# Altium footprint library IC.PcbLib: 67 footprints (part 2 of 5)
Each footprint in its own frame and in the unit in brackets; x right, y up, seen from the top. Pads: shape width x height; smd on the part's side, far side on the other; paste and mask are expansions set on the pad; w line width, h text height; cw(c..) or ccw(c..) is an arc to the next point about the centre after c.
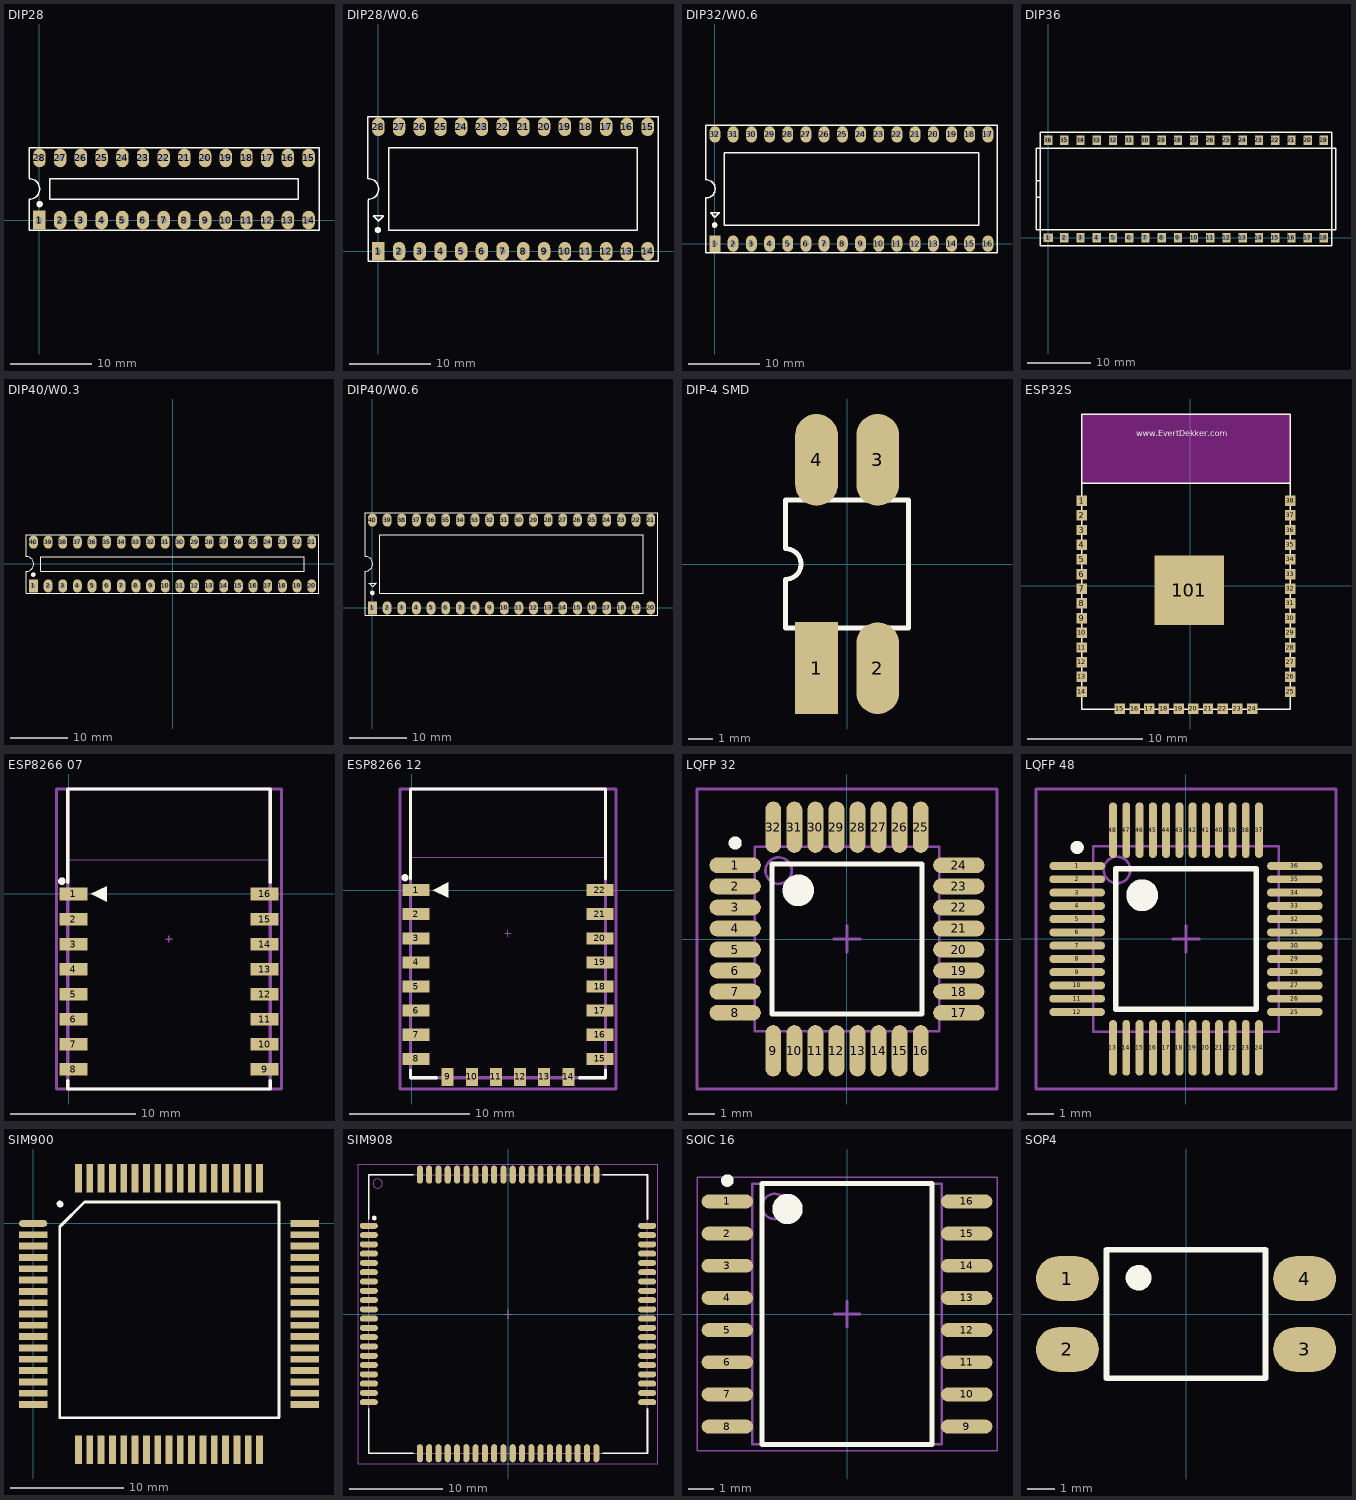
[diagram p1: the footprints below, top view; thin cyan lines are the x and y axes]

## DIP28 [mil] "28 PIN, W 300mil, Pin to pin 100mil"
height 100
pads (28):
  rect 60x90 hole 31: 1(0,0)
  oval 60x90 hole 31: 2(100,0) 3(200,0) 4(300,0) 5(400,0) 6(500,0) 7(600,0) 8(700,0) 9(800,0) 10(900,0) 11(1000,0) 12(1100,0) 13(1200,0) 14(1300,0) 15(1300,300) 16(1200,300) 17(1100,300) 18(1000,300) 19(900,300) 20(800,300) 21(700,300) 22(600,300) 23(500,300) 24(400,300) 25(300,300) 26(200,300) 27(100,300) 28(0,300)
Top Overlay:
  circle w15: c1,77 r8
  lines w7: -50.38,100.05 ccw(c-48.69,150.02) -50,200 ; -50,100 -50,-50 1350,-50 1350,350 -50,350 -50,201 ; 50,100 50,200 1250,200 1250,100 50,100
3D body "SW3dPS-DIP28-300.STEP": height 200, standoff -98.03, extent -50,-10 1367.32,299.84

## DIP28/W0.6 [mil] "DIP28/W.600, Pin to pin 100mil"
height 100
pads (28):
  rect 60x90 hole 31: 1(0,0)
  oval 60x90 hole 31: 2(100,0) 3(200,0) 4(300,0) 5(400,0) 6(500,0) 7(600,0) 8(700,0) 9(800,0) 10(900,0) 11(1000,0) 12(1100,0) 13(1200,0) 14(1300,0) 15(1300,600) 16(1200,600) 17(1100,600) 18(1000,600) 19(900,600) 20(800,600) 21(700,600) 22(600,600) 23(500,600) 24(400,600) 25(300,600) 26(200,600) 27(100,600) 28(0,600)
Top Overlay:
  circle w15: c-2,102 r8
  lines w7: -51,350 -51,650 1350,650 1350,-50 -50,-50 -50,249 ; -50,250 ccw(c-48.31,299.97) -49.62,349.95 ; -25,170 23,170 24,171 24,169 0,145 0,146 -24,170 -25,170 ; 50,100 50,500 1250,500 1250,100 50,100
3D body "SW3dPS-DIP28-600.STEP": height 224.41, standoff -101.57, extent -84.25,0.16 1384.25,610

## DIP32/W0.6 [mil] "DIP32/W.600, Pin to pin 100mil"
height 100
pads (32):
  rect 60x90 hole 31: 1(0,0)
  oval 60x90 hole 31: 2(100,0) 3(200,0) 4(300,0) 5(400,0) 6(500,0) 7(600,0) 8(700,0) 9(800,0) 10(900,0) 11(1000,0) 12(1100,0) 13(1200,0) 14(1300,0) 15(1400,0) 16(1500,0) 17(1500,600) 18(1400,600) 19(1300,600) 20(1200,600) 21(1100,600) 22(1000,600) 23(900,600) 24(800,600) 25(700,600) 26(600,600) 27(500,600) 28(400,600) 29(300,600) 30(200,600) 31(100,600) 32(0,600)
Top Overlay:
  circle w15: c-2,102 r8
  lines w7: -50.38,251.05 ccw(c-48.69,301.02) -50,351 ; -50,251 -50,-50 1550,-50 1550,650 -50,650 -50,352 ; -25,170 -24,170 0,146 0,145 24,169 24,171 23,170 -25,170 ; 50,100 50,500 1450,500 1450,100 50,100
3D body "SW3DPS-DIP 32 IC WITH 0_380IN WINDOW-DEFAULT.STEP": height 227.95, standoff -129.92, extent -77.56,0 1577.56,601.81

## DIP36 [mil] "W.600/L1.850"
pads (36):
  rect 59x51 / inner rect 58x58 / far side rect 59x51 hole 34: 1(0,0)
  rect 51x59 / inner round 58 / far side rect 51x59 hole 34: 2(100,0) 3(200,0) 4(300,0) 5(400,0) 6(500,0) 7(600,0) 8(700,0) 9(800,0) 10(900,0) 11(1000,0) 12(1100,0) 13(1200,0) 14(1300,0) 15(1400,0) 16(1500,0) 17(1600,0) 18(1700,0) 19(1700,600) 20(1600,600) 21(1500,600) 22(1400,600) 23(1300,600) 24(1200,600) 25(1100,600) 26(1000,600) 27(900,600) 28(800,600) 29(700,600) 30(600,600) 31(500,600) 32(400,600) 33(300,600) 34(200,600) 35(100,600) 36(0,600)
Top Overlay:
  lines w8: -75,50 -75,250 ; -75,50 1775,50 ; -75,50 -75,250 ; -75,50 1775,50 ; -75,250 -50,250 ; -75,250 -75,350 ; -75,250 -50,250 ; -75,250 -75,350 ; -75,350 -50,350 ; -75,350 -75,550 ; -75,350 -50,350 ; -75,350 -75,550 ; -75,550 1775,550 ; -75,550 1775,550 ; -50,250 -50,350 ; -50,250 -50,350 ; -50,350 -50,650 1750,650 1750,-50 -50,-50 -50,350 ; 1775,50 1775,550 ; 1775,50 1775,550

## DIP40/W0.3 [mil] "40 PIN, W 300mil, Pin to pin 100mil"
height 100
pads (40):
  rect 60x90 hole 31: 1(-950,-150)
  oval 60x90 hole 31: 2(-850,-150) 3(-750,-150) 4(-650,-150) 5(-550,-150) 6(-450,-150) 7(-350,-150) 8(-250,-150) 9(-150,-150) 10(-50,-150) 11(50,-150) 12(150,-150) 13(250,-150) 14(350,-150) 15(450,-150) 16(550,-150) 17(650,-150) 18(750,-150) 19(850,-150) 20(950,-150) 21(950,150) 22(850,150) 23(750,150) 24(650,150) 25(550,150) 26(450,150) 27(350,150) 28(250,150) 29(150,150) 30(50,150) 31(-50,150) 32(-150,150) 33(-250,150) 34(-350,150) 35(-450,150) 36(-550,150) 37(-650,150) 38(-750,150) 39(-850,150) 40(-950,150)
Top Overlay:
  circle w15: c-951,-72 r8
  lines w7: -1000.38,-49.95 ccw(c-998.68,0.02) -1000,50 ; -1000,-50 -1000,-200 1000,-200 1000,200 -1000,200 -1000,51 ; -900,-50 -900,50 900,50 900,-50 -900,-50
3D body "SW3DPS-DIP 40 IC WITH 0_320IN WINDOW-DEFAULT.STEP": height 227.95, standoff -129.92, extent -1020,-310.91 1050.87,290.91

## DIP40/W0.6 [mil] "40 PIN, W 600mil, Pin to pin 100mil"
height 100
pads (40):
  rect 60x90 hole 31: 1(0,0)
  oval 60x90 hole 31: 2(100,0) 3(200,0) 4(300,0) 5(400,0) 6(500,0) 7(600,0) 8(700,0) 9(800,0) 10(900,0) 11(1000,0) 12(1100,0) 13(1200,0) 14(1300,0) 15(1400,0) 16(1500,0) 17(1600,0) 18(1700,0) 19(1800,0) 20(1900,0) 21(1900,600) 22(1800,600) 23(1700,600) 24(1600,600) 25(1500,600) 26(1400,600) 27(1300,600) 28(1200,600) 29(1100,600) 30(1000,600) 31(900,600) 32(800,600) 33(700,600) 34(600,600) 35(500,600) 36(400,600) 37(300,600) 38(200,600) 39(100,600) 40(0,600)
Top Overlay:
  circle w15: c-1,102 r8
  lines w7: -50.38,251.05 ccw(c-48.69,301.02) -50,351 ; -50,251 -50,-50 1950,-50 1950,650 -50,650 -50,352 ; -24,170 -23,170 1,146 1,145 25,169 25,171 24,170 -24,170 ; 50,100 1850,100 1850,500 50,500 50,100
3D body "SW3dPS-DIP40-600.STEP": height 224.41, standoff -101.57, extent -82.48,-10 1982.48,599.84

## DIP-4 SMD [mil] "DIP; 4 Leads; Row Spacing 7.62 mm; Pitch 2.54 mm"
height 179.92
pads (4):
  rect 70x150 smd: 1(-50,-170)
  oval 70x150 smd: 2(50,-170) 3(50,170) 4(-50,170)
Top Overlay:
  lines w7.87: -100.39,-104.33 100.39,-104.33 100.39,104.33 -100.39,104.33 -100.39,25 cw(c-100.39,0) -100.39,-25 -100.39,-104.33
3D body "DIP 4 SMD.step": height 181.77, standoff 0.6, extent -98.39,-209.9 102.39,201.91

## ESP32S [mm]
pads (39):
  rect 0.9x0.9 smd: 1(-9.398,7.366) 2(-9.398,6.096) 3(-9.398,4.826) 4(-9.398,3.556) 5(-9.398,2.286) 6(-9.398,1.016) 7(-9.398,-0.254) 8(-9.398,-1.524) 9(-9.398,-2.794) 10(-9.398,-4.064) 11(-9.398,-5.334) 12(-9.398,-6.604) 13(-9.398,-7.874) 14(-9.398,-9.144) 15(-6.098,-10.634) 16(-4.828,-10.634) 17(-3.558,-10.634) 18(-2.288,-10.634) 19(-1.018,-10.634) 20(0.252,-10.634) 21(1.522,-10.634) 22(2.792,-10.634) 23(4.062,-10.634) 24(5.332,-10.634) 25(8.636,-9.144) 26(8.636,-7.874) 27(8.636,-6.604) 28(8.636,-5.334) 29(8.636,-4.064) 30(8.636,-2.794) 31(8.636,-1.524) 32(8.636,-0.254) 33(8.636,1.016) 34(8.636,2.286) 35(8.636,3.556) 36(8.636,4.826) 37(8.636,6.096) 38(8.636,7.366)
  rect 6x6 smd: 101(-0.098,-0.368)
Top Overlay:
  lines w0.127: -9.398,8.89 8.636,8.89 ; -9.398,-10.668 8.636,-10.668 8.636,14.859 -9.398,14.859 -9.398,-10.668
  text "www.EvertDekker.com" at -4.699,12.954 h0.5
Keep-Out Layer:
  rectangle: -9.398,8.89 8.636,14.859
3D body: height 2, standoff 0.8, extent -8.763,-10.033 8.128,8.89
3D body: height 0.8, standoff 0, extent -9.398,-10.668 8.636,14.859

## ESP8266 07 [mm] "ESP-12 Wi-Fi Module by AI-Thinker"
height 3.2
pads (16):
  rect 2.25x1 smd: 1(0.375,0) 2(0.375,-2) 3(0.375,-4) 4(0.375,-6) 5(0.375,-8) 6(0.375,-10) 7(0.375,-12) 8(0.375,-14) 9(15.625,-14) 10(15.625,-12) 11(15.625,-10) 12(15.625,-8) 13(15.625,-6) 14(15.625,-4) 15(15.625,-2) 16(15.625,0)
Top Overlay:
  circle w0.3: c-0.55,1.025 r0.15
  region: 1.77,0 3.04,-0.635 3.04,0.635
  lines w0.254: -0.084,-14.916 -0.084,-15.568 16.084,-15.568 16.084,-14.916 ; -0.084,0.916 -0.084,8.371 16.084,8.371 16.084,0.916
Mechanical 13:
  lines w0.051: -0.127,2.727 -0.127,8.382 16.129,8.382 16.129,2.727 -0.127,2.727
  lines w0.254: -0.084,-15.568 16.084,-15.568 16.084,8.371 -0.084,8.371 -0.084,-15.568
  text "CUTOUT POLYGON" at 0.127,7.366 h0.25
  text "ANTENNA AREA" at 0.127,7.874 h0.25
Mechanical 15:
  lines w0.1: 7.746,-3.598 8.254,-3.598 ; 8,-3.852 8,-3.344
  lines w0.254: -0.975,-15.568 -0.975,8.371 16.975,8.371 16.975,-15.568 -0.975,-15.568
3D body "ESP_12_E.STEP": height 2.75, standoff 0.04, extent 0.001,-15.491 16.001,8.509

## ESP8266 12 [mm] "ESP-12 Wi-Fi Module by AI-Thinker"
height 3.2
pads (22):
  rect 2.25x1 smd: 1(0.375,0) 2(0.375,-2) 3(0.375,-4) 4(0.375,-6) 5(0.375,-8) 6(0.375,-10) 7(0.375,-12) 8(0.375,-14) 15(15.625,-14) 16(15.625,-12) 17(15.625,-10) 18(15.625,-8) 19(15.625,-6) 20(15.625,-4) 21(15.625,-2) 22(15.625,0)
  rect 1x1.5 smd: 9(3,-15.5) 10(5,-15.5) 11(7,-15.5) 12(9,-15.5) 13(11,-15.5) 14(13,-15.5)
Top Overlay:
  circle w0.3: c-0.55,1.025 r0.15
  region: 1.77,0 3.04,-0.635 3.04,0.635
  lines w0.254: -0.084,-14.916 -0.084,-15.568 2.068,-15.568 ; -0.084,0.916 -0.084,8.371 16.084,8.371 16.084,0.916 ; 13.932,-15.568 16.084,-15.568 16.084,-14.916
Mechanical 13:
  lines w0.051: -0.127,2.727 16.129,2.727 16.129,8.382 -0.127,8.382 -0.127,2.727
  lines w0.254: -0.084,-15.568 -0.084,8.371 16.084,8.371 16.084,-15.568 -0.084,-15.568
  text "ANTENNA AREA" at 0.127,7.874 h0.25
  text "CUTOUT POLYGON" at 0.127,7.366 h0.25
Mechanical 15:
  lines w0.1: 7.746,-3.598 8.254,-3.598 ; 8,-3.852 8,-3.344
  lines w0.254: -0.975,-16.5 16.975,-16.5 16.975,8.371 -0.975,8.371 -0.975,-16.5
3D body "ESP_12_E.STEP": height 2.75, standoff 0.04, extent 0.001,-15.491 16.001,8.509

## LQFP 32 [mm] "Thin QFP, 32-Leads, Body 7x7mm, Pitch 0.8mm, IPC Low Density"
height 1.2
pads (32):
  oval 1.95x0.6 smd: 1(-4.25,2.8) 2(-4.25,2) 3(-4.25,1.2) 4(-4.25,0.4) 5(-4.25,-0.4) 6(-4.25,-1.2) 7(-4.25,-2) 8(-4.25,-2.8) 17(4.25,-2.8) 18(4.25,-2) 19(4.25,-1.2) 20(4.25,-0.4) 21(4.25,0.4) 22(4.25,1.2) 23(4.25,2) 24(4.25,2.8)
  oval 0.6x1.95 smd: 9(-2.8,-4.25) 10(-2,-4.25) 11(-1.2,-4.25) 12(-0.4,-4.25) 13(0.4,-4.25) 14(1.2,-4.25) 15(2,-4.25) 16(2.8,-4.25) 25(2.8,4.25) 26(2,4.25) 27(1.2,4.25) 28(0.4,4.25) 29(-0.4,4.25) 30(-1.2,4.25) 31(-2,4.25) 32(-2.8,4.25)
Top Overlay:
  circle w0.25: c-4.25,3.65 r0.125
  circle w0.6: c-1.85,1.85 r0.3
  lines w0.2: -2.85,-2.85 -2.85,2.85 2.85,2.85 2.85,-2.85 -2.85,-2.85
Mechanical 13:
  circle w0.1: c-2.6,2.6 r0.5
  lines w0.1: -3.5,-3.5 -3.5,3.5 3.5,3.5 3.5,-3.5 -3.5,-3.5
Mechanical 15:
  lines w0.1: -0.5,0 0.5,0 ; 0,-0.5 0,0.5 ; -5.7,-5.7 -5.7,5.7 5.7,5.7 5.7,-5.7 -5.7,-5.7
3D body "LQFP32-0_8.step": height 1.61, standoff -0.05, extent -4.494,-4.519 4.545,4.519

## LQFP 48 [mm] "Thin QFP, 48-Leads, Body 7x7mm, Pitch 0.5mm, IPC Low Density"
height 1.6
pads (48):
  oval 2.1x0.3 smd: 1(-4.1,2.75) 2(-4.1,2.25) 3(-4.1,1.75) 4(-4.1,1.25) 5(-4.1,0.75) 6(-4.1,0.25) 7(-4.1,-0.25) 8(-4.1,-0.75) 9(-4.1,-1.25) 10(-4.1,-1.75) 11(-4.1,-2.25) 12(-4.1,-2.75) 25(4.1,-2.75) 26(4.1,-2.25) 27(4.1,-1.75) 28(4.1,-1.25) 29(4.1,-0.75) 30(4.1,-0.25) 31(4.1,0.25) 32(4.1,0.75) 33(4.1,1.25) 34(4.1,1.75) 35(4.1,2.25) 36(4.1,2.75)
  oval 0.3x2.1 smd: 13(-2.75,-4.1) 14(-2.25,-4.1) 15(-1.75,-4.1) 16(-1.25,-4.1) 17(-0.75,-4.1) 18(-0.25,-4.1) 19(0.25,-4.1) 20(0.75,-4.1) 21(1.25,-4.1) 22(1.75,-4.1) 23(2.25,-4.1) 24(2.75,-4.1) 37(2.75,4.1) 38(2.25,4.1) 39(1.75,4.1) 40(1.25,4.1) 41(0.75,4.1) 42(0.25,4.1) 43(-0.25,4.1) 44(-0.75,4.1) 45(-1.25,4.1) 46(-1.75,4.1) 47(-2.25,4.1) 48(-2.75,4.1)
Top Overlay:
  circle w0.25: c-4.1,3.45 r0.125
  circle w0.6: c-1.65,1.65 r0.3
  lines w0.2: -2.65,-2.65 -2.65,2.65 2.65,2.65 2.65,-2.65 -2.65,-2.65
Mechanical 13:
  circle w0.1: c-2.6,2.6 r0.5
  lines w0.1: -3.5,-3.5 -3.5,3.5 3.5,3.5 3.5,-3.5 -3.5,-3.5
Mechanical 15:
  lines w0.1: -0.5,0 0.5,0 ; 0,-0.5 0,0.5 ; -5.65,-5.65 -5.65,5.65 5.65,5.65 5.65,-5.65 -5.65,-5.65
3D body: height 1.6, standoff 0, extent -3.5,-3.5 3.5,3.5

## SIM900 [mm]
pads (68):
  oval 2.5x0.6 smd: 1(0,0)
  rect 2.5x0.6 smd: 2(0,-1) 3(0,-2) 4(0,-3) 5(0,-4) 6(0,-5) 7(0,-6) 8(0,-7) 9(0,-8) 10(0,-9) 11(0,-10) 12(0,-11) 13(0,-12) 14(0,-13) 15(0,-14) 16(0,-15) 17(0,-16) 35(24,-16) 36(24,-15) 37(24,-14) 38(24,-13) 39(24,-12) 40(24,-11) 41(24,-10) 42(24,-9) 43(24,-8) 44(24,-7) 45(24,-6) 46(24,-5) 47(24,-4) 48(24,-3) 49(24,-2) 50(24,-1) 51(24,0)
  rect 0.6x2.5 smd: 18(4,-20) 19(5,-20) 20(6,-20) 21(7,-20) 22(8,-20) 23(9,-20) 24(10,-20) 25(11,-20) 26(12,-20) 27(13,-20) 28(14,-20) 29(15,-20) 30(16,-20) 31(17,-20) 32(18,-20) 33(19,-20) 34(20,-20) 52(20,4) 53(19,4) 54(18,4) 55(17,4) 56(16,4) 57(15,4) 58(14,4) 59(13,4) 60(12,4) 61(11,4) 62(10,4) 63(9,4) 64(8,4) 65(7,4) 66(6,4) 67(5,4) 68(4,4)
Top Overlay:
  lines w0.25: 2.586,-17.16 21.697,-17.16 21.717,-17.14 21.717,1.547 ; 2.675,-17.163 2.357,-17.163 2.347,-17.153 2.347,-0.297 4.526,1.882 21.707,1.882 21.714,1.875 21.714,1.478
  lines w0.55: 2.349,1.73 2.4,1.679 2.413,1.679 2.416,1.679 2.423,1.687
3D body "SIM900.step": height 3.04, standoff 0.02, extent 0,-20 24,4

## SIM908 [mm]
height 3
pads (80):
  oval 1.95x0.65 smd: 1(-15,9.5) 2(-15,8.5) 3(-15,7.5) 4(-15,6.5) 5(-15,5.5) 6(-15,4.5) 7(-15,3.5) 8(-15,2.5) 9(-15,1.5) 10(-15,0.5) 11(-15,-0.5) 12(-15,-1.5) 13(-15,-2.5) 14(-15,-3.5) 15(-15,-4.5) 16(-15,-5.5) 17(-15,-6.5) 18(-15,-7.5) 19(-15,-8.5) 20(-15,-9.5) 41(14.98,-9.5) 42(14.98,-8.5) 43(14.98,-7.5) 44(14.98,-6.5) 45(14.98,-5.5) 46(14.98,-4.5) 47(14.98,-3.5) 48(14.98,-2.5) 49(14.98,-1.5) 50(14.98,-0.5) 51(14.98,0.5) 52(14.98,1.5) 53(14.98,2.5) 54(14.98,3.5) 55(14.98,4.5) 56(14.98,5.5) 57(14.98,6.5) 58(14.98,7.5) 59(14.98,8.5) 60(14.98,9.5)
  oval 0.65x1.95 smd: 21(-9.5,-15) 22(-8.5,-15) 23(-7.5,-15) 24(-6.5,-15) 25(-5.5,-15) 26(-4.5,-15) 27(-3.5,-15) 28(-2.5,-15) 29(-1.5,-15) 30(-0.5,-15) 31(0.5,-15) 32(1.5,-15) 33(2.5,-15) 34(3.5,-15) 35(4.5,-15) 36(5.5,-15) 37(6.5,-15) 38(7.5,-15) 39(8.5,-15) 40(9.5,-15) 61(9.5,15.005) 62(8.5,15.005) 63(7.5,15.005) 64(6.5,15.005) 65(5.5,15.005) 66(4.5,15.005) 67(3.5,15.005) 68(2.5,15.005) 69(1.5,15.005) 70(0.5,15.005) 71(-0.5,15.005) 72(-1.5,15.005) 73(-2.5,15.005) 74(-3.5,15.005) 75(-4.5,15.005) 76(-5.5,15.005) 77(-6.5,15.005) 78(-7.5,15.005) 79(-8.5,15.005) 80(-9.5,15.005)
Top Overlay:
  circle w0.25: c-14.405,10.335 r0.125
  lines w0.2: -15,-10.225 -15,-15 -10.225,-15 ; -15,10.225 -15,15 -10.225,15 ; 10.225,-15 15,-15 15,-10.225 ; 10.225,15 15,15 15,10.225
Mechanical 13:
  circle w0.1: c-14.05,14.05 r0.5
  lines w0.1: -15,-15 15,-15 15,15 -15,15 -15,-15
Mechanical 15:
  lines w0.1: -0.5,0 0.5,0 ; 0,-0.5 0,0.5 ; -16.145,-16.155 16.125,-16.155 16.125,16.155 -16.145,16.155 -16.145,-16.155
3D body "User Library-SIM908.STEP": height 3.22, standoff 0.02, extent -14.995,-15 15.005,15

## SOIC 16 [mm] "SOIC, 16-Leads, Body 10.30x7.50mm, Pitch 1.27mm, IPC Medium Density"
height 2.4
pads (16):
  oval 2.032x0.55 smd: 1(-4.725,4.445) 2(-4.725,3.175) 3(-4.725,1.905) 4(-4.725,0.635) 5(-4.725,-0.635) 6(-4.725,-1.905) 7(-4.725,-3.175) 8(-4.725,-4.445) 9(4.725,-4.445) 10(4.725,-3.175) 11(4.725,-1.905) 12(4.725,-0.635) 13(4.725,0.635) 14(4.725,1.905) 15(4.725,3.175) 16(4.725,4.445)
Top Overlay:
  circle w0.25: c-4.725,5.27 r0.125
  circle w0.6: c-2.35,4.15 r0.3
  lines w0.2: -3.35,-5.15 -3.35,5.15 3.35,5.15 3.35,-5.15 -3.35,-5.15
Mechanical 13:
  circle w0.1: c-2.85,4.25 r0.5
  lines w0.1: -3.75,-5.15 -3.75,5.15 3.75,5.15 3.75,-5.15 -3.75,-5.15
Mechanical 15:
  lines w0.05: -5.925,-5.4 -5.925,5.4 5.925,5.4 5.925,-5.4 -5.925,-5.4
  lines w0.1: -0.5,0 0.5,0 ; 0,-0.5 0,0.5
3D body "User Library-SO-16W.STEP": height 2.48, standoff 0, extent -5.155,-5.165 5.155,5.165

## SOP4 [mm]
pads (4):
  oval 2.25x1.6 smd: 1(-4.25,1.27) 2(-4.25,-1.27) 3(4.25,-1.27) 4(4.25,1.27)
Top Overlay:
  circle w0.2: c-1.7,1.3 r0.361
  region: -1.4,1.003 -2.006,1.003 -2.006,1.6 -1.4,1.6
  lines w0.2: -2.85,-2.3 2.85,-2.3 2.85,2.3 -2.85,2.3 -2.85,-2.3
3D body "pc817x1nip1b.stp": height 3.6, standoff 0, extent -4.673,-2.286 4.927,2.314